# Altium footprint library My_Intlib.PcbLib: 224 footprints (part 10 of 14)
Each footprint in its own frame and in the unit in brackets; x right, y up, seen from the top. Pads: shape width x height; smd on the part's side, far side on the other; paste and mask are expansions set on the pad; w line width, h text height; cw(c..) or ccw(c..) is an arc to the next point about the centre after c.
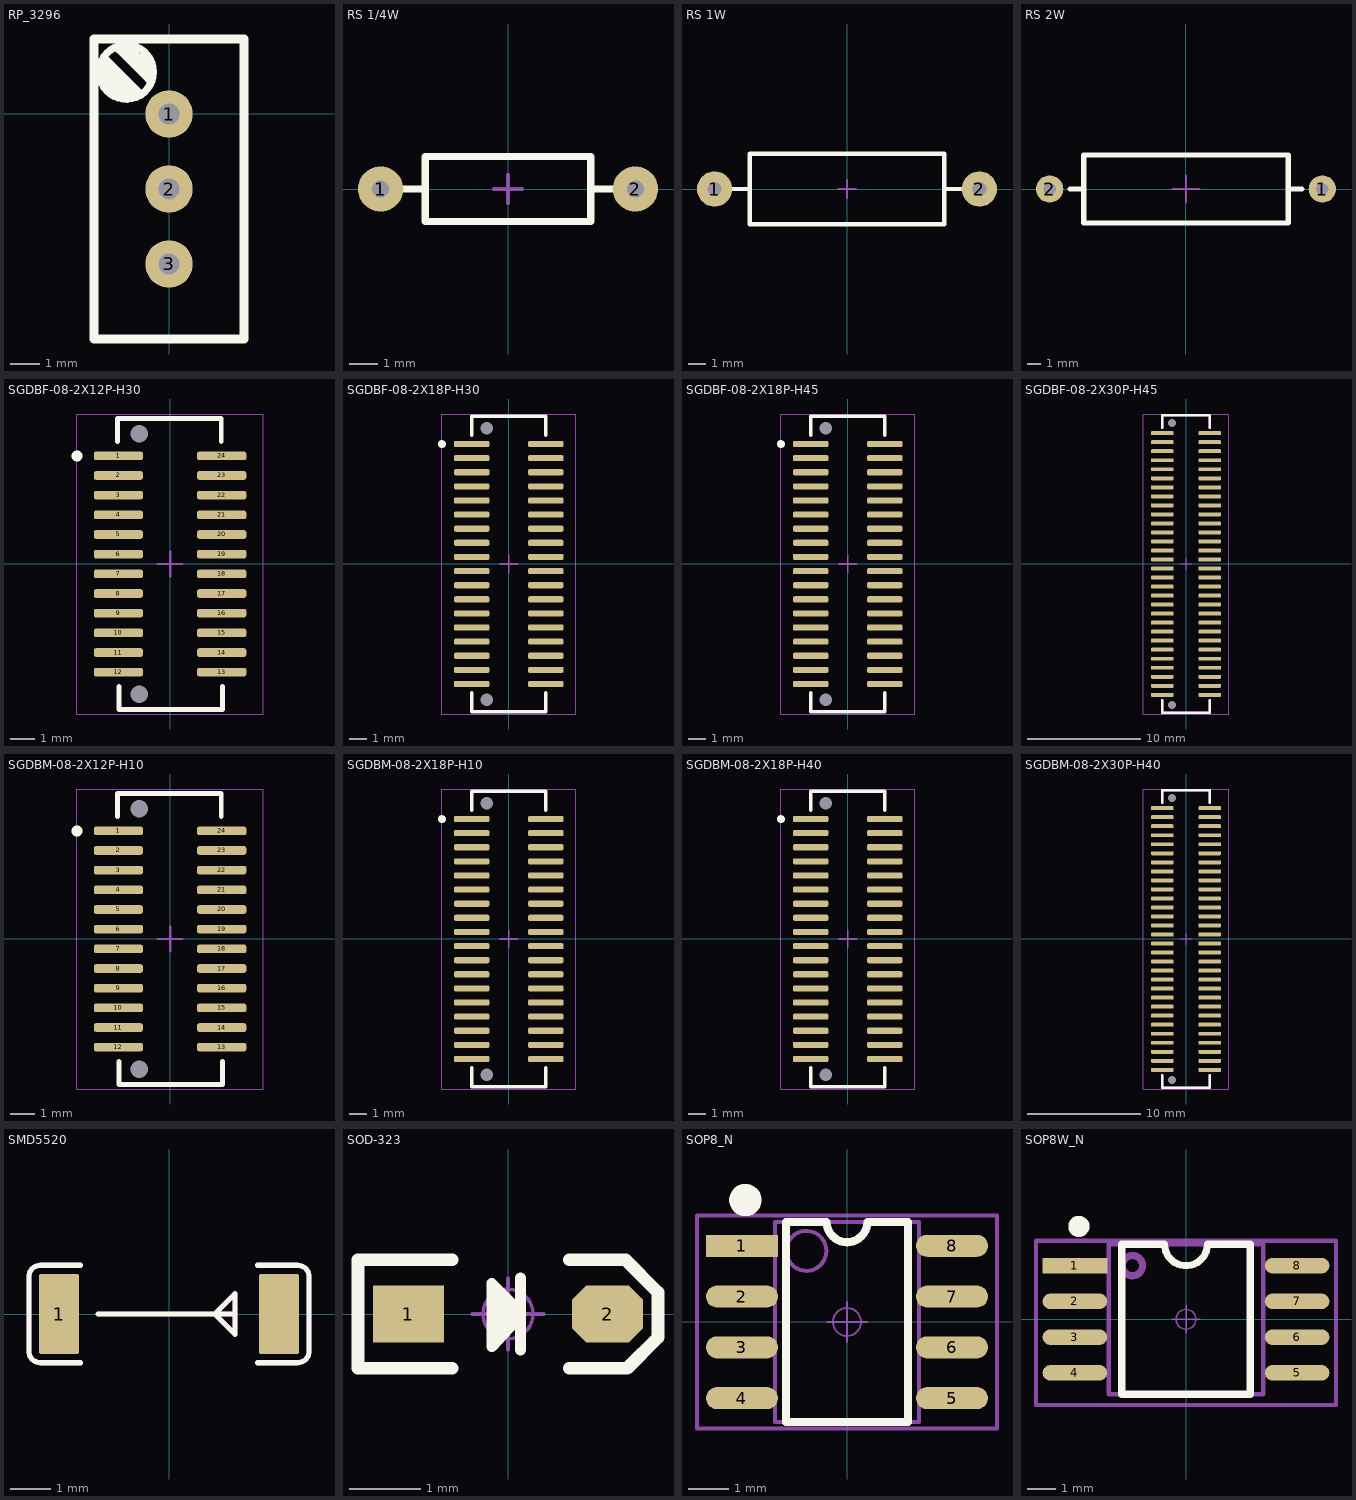
[diagram p9: the footprints below, top view; thin cyan lines are the x and y axes]

## RP_3296 [mm]
pads (3):
  round 1.6 hole 0.7: 1(0,0) 2(0,-2.54) 3(0,-5.08)
Top Overlay:
  circle w0.254: c-1.448,1.422 r0.916
  lines w0.254: -2.21,1.93 -1.702,1.422 -0.94,0.66 -1.194,0.66 -2.21,1.676 -2.21,1.168 ; -1.702,2.184 -0.686,1.168 -0.686,1.422 ; -0.857,1.594 -0.857,1.759 -0.686,1.93 ; -0.734,1.978 -0.686,1.93 ; -2.21,1.168 -1.956,1.168 ; -2.21,1.168 -1.956,1.422 -1.956,1.168 ; -2.21,1.168 -1.956,0.914 ; -1.956,0.914 -1.702,0.66 -1.448,0.66 -1.956,1.168 ; -1.956,0.914 -1.956,1.168 ; -0.686,1.422 -0.686,1.93 ; -0.686,1.422 -1.088,1.824 -1.088,1.978 -1.448,2.338 -1.548,2.338 -1.188,1.978 -1.188,1.925 -1.182,1.93 -0.686,1.93
  lines w0.305: 2.438,2.54 -2.54,2.54 -2.54,-7.62 2.54,-7.62 2.54,2.54
Top Value:
  text ".Comment" at 3.251,-1.906 h0.89
Top Assembly:
  text ".Designator" at 3.251,-1.113 h0.89
3D body "User Library-3296W.STEP": height 11.55, standoff -1.6, extent -2.412,-7.229 2.388,2.301

## RS 1/4W [mm] "直插色环电阻，脚距9mm，直径2.3mm"
pads (2):
  round 1.6 hole 0.6: 1(-4.5,0) 2(4.5,0)
Top Overlay:
  lines w0.254: -3.683,0 -3.048,0 ; 3.048,0 3.683,0 ; -2.921,-1.143 -2.921,1.143 2.921,1.143 2.921,-1.143 -2.921,-1.143
Mechanical 15:
  lines w0.127: -0.508,0 0.508,0 ; 0,-0.508 0,0.508
3D body "RS 1-4W.STEP": height 2.32, standoff -3.49, extent -4.725,-1.16 4.725,1.16

## RS 1W [mm] "直插色环电阻，脚距15mm，直径4mm"
pads (2):
  round 2 hole 0.8: 1(-7.5,0) 2(7.5,0)
Top Overlay:
  lines w0.254: -6.5,0 -5.5,0 ; 5.5,0 6.5,0 ; -5.5,-2 5.5,-2 5.5,2 -5.5,2 -5.5,-2
Mechanical 15:
  lines w0.1: -0.508,0 0.508,0 ; 0,-0.508 0,0.508
3D body "RS 1W.STEP": height 4.11, standoff -3.4, extent -7.8,-2.01 7.8,2.01

## RS 2W [mm] "直插色环电阻，脚距20mm，直径5mm"
pads (2):
  round 2 hole 0.9: 1(10,0) 2(-10,0)
Top Overlay:
  lines w0.381: -8.5,0 -7.5,0 ; 7.628,0 8.5,0 ; -7.5,-2.5 -7.5,2.5 7.5,2.5 7.5,-2.5 -7.5,-2.5
Mechanical 15:
  lines w0.127: -1.016,0 1.016,0 ; 0,-1.016 0,1.016
3D body "RS 2W.STEP": height 5.11, standoff -3.4, extent -10.4,-2.51 10.4,2.51

## SGDBF-08-2X12P-H30 [mm] "板对板连接器，母端，脚距0.8mm，2*12pin，高3mm"
height 2
pads (26):
  rrect50% 2x0.35 smd: 1(-2.1,4.4) 2(-2.1,3.6) 3(-2.1,2.8) 4(-2.1,2) 5(-2.1,1.2) 6(-2.1,0.4) 7(-2.1,-0.4) 8(-2.1,-1.2) 9(-2.1,-2) 10(-2.1,-2.8) 11(-2.1,-3.6) 12(-2.1,-4.4) 13(2.1,-4.4) 14(2.1,-3.6) 15(2.1,-2.8) 16(2.1,-2) 17(2.1,-1.2) 18(2.1,-0.4) 19(2.1,0.4) 20(2.1,1.2) 21(2.1,2) 22(2.1,2.8) 23(2.1,3.6) 24(2.1,4.4)
  round 0 hole 0.7 unplated mask+0: ""(-1.25,-5.3) ""(-1.25,5.3)
Top Overlay:
  circle w0.25: c-3.785,4.394 r0.1
  lines w0.2: -2.134,4.978 -2.134,5.922 2.083,5.922 2.083,4.978 ; -2.083,-4.978 -2.083,-5.922 2.134,-5.922 2.134,-4.978
Top Value:
  text ".Comment" at 3.531,1.421 h0.89
Top Assembly:
  text ".Designator" at 3.531,2.215 h0.89
Mechanical 15:
  lines w0.05: -3.8,-6.1 3.8,-6.1 3.8,6.1 -3.8,6.1 -3.8,-6.1
  lines w0.1: -0.5,0 0.5,0 ; 0,-0.5 0,0.5
3D body "SGDBF-08-024P-H30.SLDPRT": height 2.97, standoff -0.58, extent -2.6,-5.75 2.6,5.75

## SGDBF-08-2X18P-H30 [mm] "板对板连接器，母端，脚距0.8mm，2*18pin，高3mm"
height 2
pads (38):
  rrect50% 2x0.35 smd: 1(-2.1,6.8) 2(-2.1,6) 3(-2.1,5.2) 4(-2.1,4.4) 5(-2.1,3.6) 6(-2.1,2.8) 7(-2.1,2) 8(-2.1,1.2) 9(-2.1,0.4) 10(-2.1,-0.4) 11(-2.1,-1.2) 12(-2.1,-2) 13(-2.1,-2.8) 14(-2.1,-3.6) 15(-2.1,-4.4) 16(-2.1,-5.2) 17(-2.1,-6) 18(-2.1,-6.8) 19(2.1,-6.8) 20(2.1,-6) 21(2.1,-5.2) 22(2.1,-4.4) 23(2.1,-3.6) 24(2.1,-2.8) 25(2.1,-2) 26(2.1,-1.2) 27(2.1,-0.4) 28(2.1,0.4) 29(2.1,1.2) 30(2.1,2) 31(2.1,2.8) 32(2.1,3.6) 33(2.1,4.4) 34(2.1,5.2) 35(2.1,6) 36(2.1,6.8)
  round 0 hole 0.7 unplated mask+0: ""(-1.25,-7.7) ""(-1.25,7.7)
Top Overlay:
  circle w0.25: c-3.785,6.794 r0.1
  lines w0.2: -2.1,-7.29 -2.1,-8.382 2.1,-8.382 2.1,-7.29 ; -2.1,7.29 -2.1,8.382 2.1,8.382 2.1,7.29
Top Value:
  text ".Comment" at 3.962,1.751 h0.89
Top Assembly:
  text ".Designator" at 3.962,2.545 h0.89
Mechanical 15:
  lines w0.05: -3.8,-8.5 3.8,-8.5 3.8,8.5 -3.8,8.5 -3.8,-8.5
  lines w0.1: -0.5,0 0.5,0 ; 0,-0.5 0,0.5
3D body "SGDBF-08-036P-H30_sw.STEP": height 3, standoff -0.55, extent -2.575,-8.147 2.625,8.153

## SGDBF-08-2X18P-H45 [mm] "板对板连接器，母端，脚距0.8mm，2*18pin，高4.5mm"
height 2
pads (38):
  rrect50% 2x0.35 smd: 1(-2.1,6.8) 2(-2.1,6) 3(-2.1,5.2) 4(-2.1,4.4) 5(-2.1,3.6) 6(-2.1,2.8) 7(-2.1,2) 8(-2.1,1.2) 9(-2.1,0.4) 10(-2.1,-0.4) 11(-2.1,-1.2) 12(-2.1,-2) 13(-2.1,-2.8) 14(-2.1,-3.6) 15(-2.1,-4.4) 16(-2.1,-5.2) 17(-2.1,-6) 18(-2.1,-6.8) 19(2.1,-6.8) 20(2.1,-6) 21(2.1,-5.2) 22(2.1,-4.4) 23(2.1,-3.6) 24(2.1,-2.8) 25(2.1,-2) 26(2.1,-1.2) 27(2.1,-0.4) 28(2.1,0.4) 29(2.1,1.2) 30(2.1,2) 31(2.1,2.8) 32(2.1,3.6) 33(2.1,4.4) 34(2.1,5.2) 35(2.1,6) 36(2.1,6.8)
  round 0 hole 0.7 unplated mask+0: ""(-1.25,-7.7) ""(-1.25,7.7)
Top Overlay:
  circle w0.25: c-3.785,6.794 r0.1
  lines w0.2: -2.1,-7.29 -2.1,-8.382 2.1,-8.382 2.1,-7.29 ; -2.1,7.29 -2.1,8.382 2.1,8.382 2.1,7.29
Top Value:
  text ".Comment" at 3.962,1.751 h0.89
Top Assembly:
  text ".Designator" at 3.962,2.545 h0.89
Mechanical 15:
  lines w0.05: -3.8,-8.5 -3.8,8.5 3.8,8.5 3.8,-8.5 -3.8,-8.5
  lines w0.1: -0.5,0 0.5,0 ; 0,-0.5 0,0.5
3D body "SGDBF-08-036P-H45.STEP": height 4.5, standoff -0.55, extent -2.591,-8.154 2.609,8.146

## SGDBF-08-2X30P-H45 [mm] "板对板连接器，母端，脚距0.8mm，2*30pin，高4.5mm"
height 2
pads (62):
  rrect50% 2x0.35 smd: 1(-2.1,11.6) 2(-2.1,10.8) 3(-2.1,10) 4(-2.1,9.2) 5(-2.1,8.4) 6(-2.1,7.6) 7(-2.1,6.8) 8(-2.1,6) 9(-2.1,5.2) 10(-2.1,4.4) 11(-2.1,3.6) 12(-2.1,2.8) 13(-2.1,2) 14(-2.1,1.2) 15(-2.1,0.4) 16(-2.1,-0.4) 17(-2.1,-1.2) 18(-2.1,-2) 19(-2.1,-2.8) 20(-2.1,-3.6) 21(-2.1,-4.4) 22(-2.1,-5.2) 23(-2.1,-6) 24(-2.1,-6.8) 25(-2.1,-7.6) 26(-2.1,-8.4) 27(-2.1,-9.2) 28(-2.1,-10) 29(-2.1,-10.8) 30(-2.1,-11.6) 31(2.1,-11.6) 32(2.1,-10.8) 33(2.1,-10) 34(2.1,-9.2) 35(2.1,-8.4) 36(2.1,-7.6) 37(2.1,-6.8) 38(2.1,-6) 39(2.1,-5.2) 40(2.1,-4.4) 41(2.1,-3.6) 42(2.1,-2.8) 43(2.1,-2) 44(2.1,-1.2) 45(2.1,-0.4) 46(2.1,0.4) 47(2.1,1.2) 48(2.1,2) 49(2.1,2.8) 50(2.1,3.6) 51(2.1,4.4) 52(2.1,5.2) 53(2.1,6) 54(2.1,6.8) 55(2.1,7.6) 56(2.1,8.4) 57(2.1,9.2) 58(2.1,10) 59(2.1,10.8) 60(2.1,11.6)
  round 0 hole 0.7 unplated mask+0: ""(-1.25,-12.5) ""(-1.25,12.5)
Top Overlay:
  lines w0.2: -2.1,-12.09 -2.1,-13.182 2.1,-13.182 2.1,-12.09 ; -2.1,12.09 -2.1,13.182 2.1,13.182 2.1,12.09
Top Value:
  text ".Comment" at 3.962,1.751 h0.89
Top Assembly:
  lines w0.2: -2.1,-12.09 -2.1,-13.182 2.1,-13.182 2.1,-12.09 ; -2.1,12.09 -2.1,13.182 2.1,13.182 2.1,12.09
  text ".Designator" at 3.962,2.545 h0.89
Mechanical 15:
  lines w0.05: -3.8,-13.3 3.8,-13.3 3.8,13.3 -3.8,13.3 -3.8,-13.3
  lines w0.1: -0.5,0 0.5,0 ; 0,-0.5 0,0.5
3D body "SGDBF-08-060P-H4.5.STEP": height 4.5, standoff -0.55, extent -2.597,-12.934 2.603,12.966

## SGDBM-08-2X12P-H10 [mm] "板对板连接器，公端，脚距0.8mm，2*12pin，高1mm"
height 2
pads (26):
  rrect50% 2x0.35 smd: 1(-2.1,4.4) 2(-2.1,3.6) 3(-2.1,2.8) 4(-2.1,2) 5(-2.1,1.2) 6(-2.1,0.4) 7(-2.1,-0.4) 8(-2.1,-1.2) 9(-2.1,-2) 10(-2.1,-2.8) 11(-2.1,-3.6) 12(-2.1,-4.4) 13(2.1,-4.4) 14(2.1,-3.6) 15(2.1,-2.8) 16(2.1,-2) 17(2.1,-1.2) 18(2.1,-0.4) 19(2.1,0.4) 20(2.1,1.2) 21(2.1,2) 22(2.1,2.8) 23(2.1,3.6) 24(2.1,4.4)
  round 0 hole 0.7 unplated mask+0: ""(-1.25,-5.3) ""(-1.25,5.3)
Top Overlay:
  circle w0.25: c-3.785,4.394 r0.1
  lines w0.2: -2.134,4.978 -2.134,5.922 2.083,5.922 2.083,4.978 ; -2.083,-4.978 -2.083,-5.922 2.134,-5.922 2.134,-4.978
Top Value:
  text ".Comment" at 3.683,0.304 h0.89
Top Assembly:
  text ".Designator" at 3.683,1.097 h0.89
Mechanical 15:
  lines w0.05: -3.8,-6.1 -3.8,6.1 3.8,6.1 3.8,-6.1 -3.8,-6.1
  lines w0.1: -0.5,0 0.5,0 ; 0,-0.5 0,0.5
3D body "SGDBM-08-024P-H10_sw.STEP": height 2.85, standoff -0.6, extent -2.569,-5.768 2.631,5.732

## SGDBM-08-2X18P-H10 [mm] "板对板连接器，公端，脚距0.8mm，2*18pin，高1mm"
height 2
pads (38):
  rrect50% 2x0.35 smd: 1(-2.1,6.8) 2(-2.1,6) 3(-2.1,5.2) 4(-2.1,4.4) 5(-2.1,3.6) 6(-2.1,2.8) 7(-2.1,2) 8(-2.1,1.2) 9(-2.1,0.4) 10(-2.1,-0.4) 11(-2.1,-1.2) 12(-2.1,-2) 13(-2.1,-2.8) 14(-2.1,-3.6) 15(-2.1,-4.4) 16(-2.1,-5.2) 17(-2.1,-6) 18(-2.1,-6.8) 19(2.1,-6.8) 20(2.1,-6) 21(2.1,-5.2) 22(2.1,-4.4) 23(2.1,-3.6) 24(2.1,-2.8) 25(2.1,-2) 26(2.1,-1.2) 27(2.1,-0.4) 28(2.1,0.4) 29(2.1,1.2) 30(2.1,2) 31(2.1,2.8) 32(2.1,3.6) 33(2.1,4.4) 34(2.1,5.2) 35(2.1,6) 36(2.1,6.8)
  round 0 hole 0.7 unplated mask+0: ""(-1.25,-7.7) ""(-1.25,7.7)
Top Overlay:
  circle w0.25: c-3.785,6.794 r0.1
  lines w0.2: -2.1,-7.29 -2.1,-8.382 2.1,-8.382 2.1,-7.29 ; -2.1,7.29 -2.1,8.382 2.1,8.382 2.1,7.29
Top Value:
  text ".Comment" at 4.039,0.862 h0.89
Top Assembly:
  text ".Designator" at 4.039,1.656 h0.89
Mechanical 15:
  lines w0.05: -3.8,-8.5 3.8,-8.5 3.8,8.5 -3.8,8.5 -3.8,-8.5
  lines w0.1: -0.5,0 0.5,0 ; 0,-0.5 0,0.5
3D body "SGDBM-08-036P-H10_sw.STEP": height 2.88, standoff -0.57, extent -2.575,-8.147 2.625,8.153

## SGDBM-08-2X18P-H40 [mm] "板对板连接器，公端，脚距0.8mm，2*18pin，高4mm"
height 2
pads (38):
  rrect50% 2x0.35 smd: 1(-2.1,6.8) 2(-2.1,6) 3(-2.1,5.2) 4(-2.1,4.4) 5(-2.1,3.6) 6(-2.1,2.8) 7(-2.1,2) 8(-2.1,1.2) 9(-2.1,0.4) 10(-2.1,-0.4) 11(-2.1,-1.2) 12(-2.1,-2) 13(-2.1,-2.8) 14(-2.1,-3.6) 15(-2.1,-4.4) 16(-2.1,-5.2) 17(-2.1,-6) 18(-2.1,-6.8) 19(2.1,-6.8) 20(2.1,-6) 21(2.1,-5.2) 22(2.1,-4.4) 23(2.1,-3.6) 24(2.1,-2.8) 25(2.1,-2) 26(2.1,-1.2) 27(2.1,-0.4) 28(2.1,0.4) 29(2.1,1.2) 30(2.1,2) 31(2.1,2.8) 32(2.1,3.6) 33(2.1,4.4) 34(2.1,5.2) 35(2.1,6) 36(2.1,6.8)
  round 0 hole 0.7 unplated mask+0: ""(-1.25,-7.7) ""(-1.25,7.7)
Top Overlay:
  circle w0.25: c-3.785,6.794 r0.1
  lines w0.2: -2.1,-7.29 -2.1,-8.382 2.1,-8.382 2.1,-7.29 ; -2.1,7.29 -2.1,8.382 2.1,8.382 2.1,7.29
Top Value:
  text ".Comment" at 4.039,0.862 h0.89
Top Assembly:
  text ".Designator" at 4.039,1.656 h0.89
Mechanical 15:
  lines w0.05: -3.8,-8.5 3.8,-8.5 3.8,8.5 -3.8,8.5 -3.8,-8.5
  lines w0.1: -0.5,0 0.5,0 ; 0,-0.5 0,0.5
3D body "SGDBM-08-036P-H40.STEP": height 5.9, standoff -0.55, extent -2.6,-8.147 2.6,8.153

## SGDBM-08-2X30P-H40 [mm] "板对板连接器，公端，脚距0.8mm，2*30pin，高4.0mm"
height 2
pads (62):
  rrect50% 2x0.35 smd: 1(-2.1,11.6) 2(-2.1,10.8) 3(-2.1,10) 4(-2.1,9.2) 5(-2.1,8.4) 6(-2.1,7.6) 7(-2.1,6.8) 8(-2.1,6) 9(-2.1,5.2) 10(-2.1,4.4) 11(-2.1,3.6) 12(-2.1,2.8) 13(-2.1,2) 14(-2.1,1.2) 15(-2.1,0.4) 16(-2.1,-0.4) 17(-2.1,-1.2) 18(-2.1,-2) 19(-2.1,-2.8) 20(-2.1,-3.6) 21(-2.1,-4.4) 22(-2.1,-5.2) 23(-2.1,-6) 24(-2.1,-6.8) 25(-2.1,-7.6) 26(-2.1,-8.4) 27(-2.1,-9.2) 28(-2.1,-10) 29(-2.1,-10.8) 30(-2.1,-11.6) 31(2.1,-11.6) 32(2.1,-10.8) 33(2.1,-10) 34(2.1,-9.2) 35(2.1,-8.4) 36(2.1,-7.6) 37(2.1,-6.8) 38(2.1,-6) 39(2.1,-5.2) 40(2.1,-4.4) 41(2.1,-3.6) 42(2.1,-2.8) 43(2.1,-2) 44(2.1,-1.2) 45(2.1,-0.4) 46(2.1,0.4) 47(2.1,1.2) 48(2.1,2) 49(2.1,2.8) 50(2.1,3.6) 51(2.1,4.4) 52(2.1,5.2) 53(2.1,6) 54(2.1,6.8) 55(2.1,7.6) 56(2.1,8.4) 57(2.1,9.2) 58(2.1,10) 59(2.1,10.8) 60(2.1,11.6)
  round 0 hole 0.7 unplated mask+0: ""(-1.25,-12.5) ""(-1.25,12.5)
Top Overlay:
  lines w0.2: -2.1,-12.09 -2.1,-13.182 2.1,-13.182 2.1,-12.09 ; -2.1,12.09 -2.1,13.182 2.1,13.182 2.1,12.09
Top Value:
  text ".Comment" at 3.962,1.751 h0.89
Top Assembly:
  lines w0.2: -2.1,-12.09 -2.1,-13.182 2.1,-13.182 2.1,-12.09 ; -2.1,12.09 -2.1,13.182 2.1,13.182 2.1,12.09
  text ".Designator" at 3.962,2.545 h0.89
Mechanical 15:
  lines w0.05: -3.8,-13.3 3.8,-13.3 3.8,13.3 -3.8,13.3 -3.8,-13.3
  lines w0.1: -0.5,0 0.5,0 ; 0,-0.5 0,0.5
3D body "SGDBM-08-060P-H40.STEP": height 5.9, standoff -0.55, extent -2.608,-12.948 2.592,12.952

## SMD5520 [mm] "2.0mm*5.5mm"
pads (2):
  rrect10% 1x2 smd: 1(-2.75,0) ""(2.75,0)
Top Overlay:
  lines w0.127: -2.21,-1.219 -3.214,-1.219 cw(c-3.214,-0.928) -3.505,-0.928 -3.505,0.928 cw(c-3.214,0.928) -3.214,1.219 -2.21,1.219 ; -1.778,0 1.651,0 ; 2.21,-1.219 3.214,-1.219 ccw(c3.214,-0.928) 3.505,-0.928 3.505,0.928 ccw(c3.214,0.928) 3.214,1.219 2.21,1.219 ; 1.651,0 1.651,0.508 1.146,0 1.651,-0.508 1.651,0
Top Assembly:
  lines w0.127: -2.21,-1.219 -3.214,-1.219 cw(c-3.214,-0.928) -3.505,-0.928 -3.505,0.928 cw(c-3.214,0.928) -3.214,1.219 -2.21,1.219 ; -1.778,0 1.651,0 ; 2.21,-1.219 3.214,-1.219 ccw(c3.214,-0.928) 3.505,-0.928 3.505,0.928 ccw(c3.214,0.928) 3.214,1.219 2.21,1.219 ; 1.651,0 1.651,0.508 1.146,0 1.651,-0.508 1.651,0
3D body "CrossAir CA-C03.STEP": height 0.95, standoff 0, extent -2.75,-1 2.75,1

## SOD-323 [mm] "1.8x1.3X0.9mm（长宽高，不包括引脚）"
pads (2):
  rect 1x0.8 smd: 1(-1.4,0)
  oct 1x0.8 smd: 2(1.4,0)
Top Overlay:
  lines w0.152: 0.178,-0.508 0.178,0.508 ; 0.178,-0.025 -0.229,-0.457 -0.229,0.432 0.178,0.025
  lines w0.178: -0.787,-0.762 -2.108,-0.762 -2.108,0.762 -0.787,0.762 ; 0.864,-0.762 1.676,-0.762 2.108,-0.33 2.108,0.305 1.651,0.762 0.864,0.762
  lines w0.254: -0.127,0.254 -0.152,-0.178 0.025,-0.025 -0.025,0.127
Top Value:
  text ".Comment" at -1.372,-2.465 h0.89
Top Assembly:
  text ".Designator" at -1.372,-1.672 h0.89
Mechanical 15:
  circle w0.05: c0,0 r0.35
  lines w0.05: -0.5,0 0.5,0 ; 0,-0.5 0,0.5
3D body "SOD-323.STEP": height 1, standoff 0.04, extent -1.337,-0.631 1.311,0.669

## SOP8_N [mm] "5*6*1.8mm（长宽高）"
height 1.75
pads (8):
  rect 1.8x0.55 smd: 1(-2.625,1.905)
  oval 1.8x0.55 smd: 2(-2.625,0.635) 3(-2.625,-0.635) 4(-2.625,-1.905) 5(2.625,-1.905) 6(2.625,-0.635) 7(2.625,0.635) 8(2.625,1.905)
Top Overlay:
  circle w0.5: c-2.54,3.048 r0.155
  lines w0.2: -1.524,2.5 -1.524,-2.5 1.524,-2.5 1.524,2.5
  lines w0.203: -1.524,2.5 -0.508,2.5 ccw(c0,2.5) 0,1.992 ccw(c0,2.5) 0.508,2.5 1.524,2.5
Top Value:
  text ".Comment" at 3.429,0.1 h0.89
Top Assembly:
  text ".Designator" at 3.429,0.894 h0.89
Mechanical 13:
  circle w0.1: c-1.016,1.778 r0.5
  lines w0.1: -1.8,-2.5 1.8,-2.5 1.8,2.5 -1.8,2.5 -1.8,-2.5
Mechanical 15:
  circle w0.05: c0,0 r0.35
  lines w0.05: -0.5,0 0.5,0 ; 0,-0.5 0,0.5
  lines w0.1: -3.75,-2.667 -3.75,2.667 3.75,2.667 3.75,-2.667 -3.75,-2.667
3D body "SOP8.STEP": height 1.9, standoff 0, extent -3.003,-2.5 3.003,2.5

## SOP8W_N [mm] "5.3*8.3*1.8mm（长宽高）"
pads (8):
  rect 2.3x0.55 smd: 1(-3.95,1.905)
  oval 2.3x0.55 smd: 2(-3.95,0.635) 3(-3.95,-0.635) 4(-3.95,-1.905) 5(3.95,-1.905) 6(3.95,-0.635) 7(3.95,0.635) 8(3.95,1.905)
Top Overlay:
  circle w0.5: c-3.81,3.302 r0.127
  lines w0.254: -2.286,-2.667 -2.286,2.667 -0.762,2.667 ccw(c0,2.667) 0.762,2.667 2.286,2.667 2.286,-2.667 -2.286,-2.667
Top Value:
  text ".Comment" at -1.676,-4.726 h0.89
Top Assembly:
  text ".Designator" at -1.676,-3.932 h0.89
Mechanical 13:
  circle w0.254: c-1.905,1.905 r0.359
  lines w0.15: -2.75,-2.667 -2.75,2.667 2.75,2.667 2.75,-2.667 -2.75,-2.667
Mechanical 15:
  circle w0.05: c0,0 r0.35
  lines w0.05: -0.5,0 0.5,0 ; 0,-0.5 0,0.5
  lines w0.15: -5.334,-3.048 5.334,-3.048 5.334,2.794 -5.334,2.794 -5.334,-3.048
3D body "SOP8W.STEP": height 1.9, standoff 0, extent -3.943,-2.64 3.943,2.64